# Altium footprint library TH IC footprints.PcbLib: 94 footprints (part 4 of 6)
Each footprint in its own frame and in the unit in brackets; x right, y up, seen from the top. Pads: shape width x height; smd on the part's side, far side on the other; paste and mask are expansions set on the pad; w line width, h text height; cw(c..) or ccw(c..) is an arc to the next point about the centre after c.
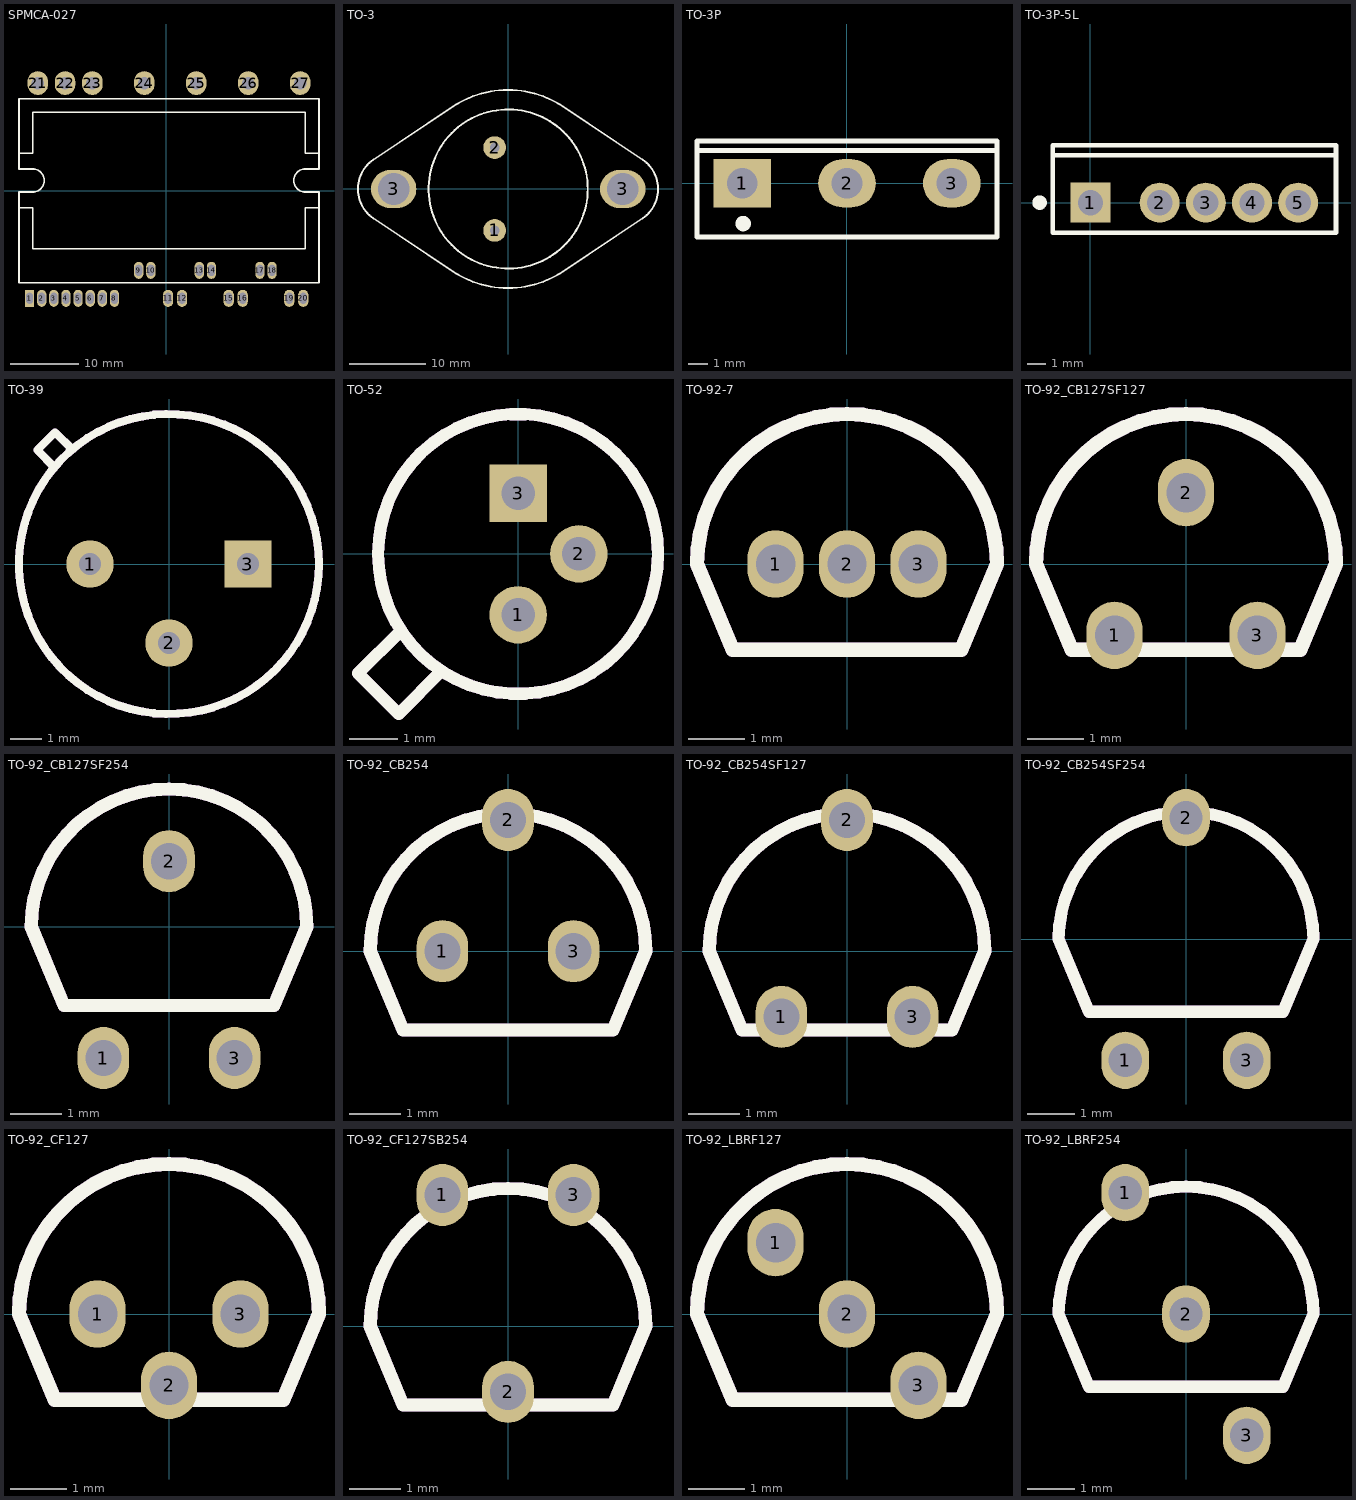
[diagram p3: the footprints below, top view; thin cyan lines are the x and y axes]

## SPMCA-027 [mm]
pads (27):
  rect 1.35x2.5 hole 1 slot 1.6 at 90 deg: 1(-20.07,-15.78)
  oval 1.35x2.5 hole 1 slot 1.6 at 90 deg: 2(-18.292,-15.78) 3(-16.514,-15.78) 4(-14.736,-15.78) 5(-12.958,-15.78) 6(-11.18,-15.78) 7(-9.402,-15.78) 8(-7.624,-15.78) 9(-4.068,-11.68) 10(-2.291,-11.68) 13(4.821,-11.68) 14(6.6,-11.68) 17(13.712,-11.68) 18(15.49,-11.68)
  oval 1.5x2.5 hole 1 slot 1.6 at 90 deg: 11(0.241,-15.78) 12(2.291,-15.78) 15(9.131,-15.78) 16(11.181,-15.78) 19(18.021,-15.78) 20(20.071,-15.78)
  oval 3x3.5 hole 1.8: 21(-18.863,15.78) 22(-14.863,15.78) 23(-10.863,15.78) 24(-3.243,15.78) 25(4.377,15.78) 26(11.997,15.78) 27(19.617,15.78)
Top Overlay:
  lines w0.254: -21.623,-2.5 -19.623,-2.5 -19.624,-8.5 20.377,-8.5 20.377,-2.5 22.377,-2.5 ; -21.623,5.5 -19.624,5.5 -19.623,11.5 20.377,11.5 20.377,5.5 22.377,5.5 ; -21.623,-13.5 22.377,-13.5 22.377,-0.2 20.377,-0.2 cw(c20.377,1.5) 20.377,3.2 22.377,3.2 22.377,13.5 -21.623,13.5 -21.623,3.2 -19.623,3.2 cw(c-19.623,1.5) -19.623,-0.2 -21.623,-0.2 -21.623,-13.5

## TO-3 [mm]
pads (4):
  round 3 hole 1.3: 1(-1.778,-5.461) 2(-1.778,5.461)
  oval 6x5 hole 4.2: 3(-15.113,0) 3(15.113,0)
Top Overlay:
  circle w0.254: c0,0 r10.5
  lines w0.254: -19.82,-0.051 ccw(c-15.22,-0.051) -17.773,-3.877 -7.246,-10.902 ccw(c-0.03,-0.089) -0.03,-13.089 -0.02,-13.089 ccw(c-0.02,-0.089) 7.196,-10.902 17.723,-3.877 ccw(c15.17,-0.051) 19.77,-0.051 19.77,0.051 ccw(c15.17,0.051) 17.723,3.877 7.196,10.902 ccw(c-0.02,0.089) -0.02,13.089 -0.03,13.089 ccw(c-0.03,0.089) -7.246,10.902 -17.773,3.877 ccw(c-15.22,0.051) -19.82,0.051 -19.82,-0.051
3D body "User Library-TO-3_Long.STEP": height 8.5, standoff -12, extent -19.757,-13.089 19.833,13.089

## TO-3P [mm]
pads (3):
  rect 3x2.5 hole 1.6: 1(-5.45,0)
  oval 3x2.5 hole 1.6: 2(0,0) 3(5.45,0)
Top Overlay:
  circle w0.4: c-5.4,-2.1 r0.2
  lines w0.254: -7.8,1.7 7.8,1.7 ; -7.8,-2.8 -7.8,2.2 7.8,2.2 7.8,-2.8 -7.8,-2.8
3D body "TO-3P.STEP": height 24.4, standoff -15.5, extent -7.9,-2.9 7.7,1.81

## TO-3P-5L [mm]
pads (5):
  rect 2.2x2.2 hole 1.4: 1(0,0)
  round 2.2 hole 1.4: 2(3.81,0) 3(6.35,0) 4(8.89,0) 5(11.43,0)
Top Overlay:
  circle w0.4: c-2.8,0 r0.2
  lines w0.254: -2.085,2.6 13.515,2.6 ; -2.085,-1.65 13.515,-1.65 13.515,3.15 -2.085,3.15 -2.085,-1.65

## TO-39 [mm]
pads (3):
  round 1.5 hole 0.7 mask+0.051: 1(-2.5,0) 2(0,-2.5)
  rect 1.5x1.5 hole 0.7 mask+0.051: 3(2.5,0)
Top Overlay:
  circle w0.254: c0,0 r4.75
  lines w0.254: -3.63,3.06 -4.17,3.61 -3.61,4.17 -3.06,3.63
Mechanical 13:
  circle w0.254: c0,0 r4.75
  lines w0.254: -3.63,3.06 -4.17,3.61 -3.61,4.17 -3.06,3.63

## TO-52 [mm]
pads (3):
  round 1.2 hole 0.7 mask+0.051: 1(0,-1.27) 2(1.27,0)
  rect 1.2x1.2 hole 0.7 mask+0.051: 3(0,1.27)
Top Overlay:
  circle w0.254: c0,0 r2.92
  lines w0.254: -2.44,-1.6 -3.34,-2.49 -2.49,-3.34 -1.6,-2.44
Mechanical 13:
  circle w0.254: c0,0 r2.92
  lines w0.254: -2.44,-1.6 -3.34,-2.49 -2.49,-3.34 -1.6,-2.44

## TO-92-7 [mm]
pads (3):
  oval 1x1.2 hole 0.7 mask+0.051: 1(-1.27,0) 2(0,0) 3(1.27,0)
Top Overlay:
  lines w0.254: -2.667,0 cw(c0,0) 2.667,0 2.032,-1.524 -2.032,-1.524 -2.667,0
Mechanical 13:
  lines w0.254: -2.667,0 cw(c0,0) 2.667,0 2.032,-1.524 -2.032,-1.524 -2.667,0
3D body "TO-92-7.SLDPRT": height 8.5, standoff -4, extent -2.5,-1.37 2.5,2.5

## TO-92_CB127SF127 [mm]
pads (3):
  oval 1x1.2 hole 0.7 mask+0.051: 1(-1.27,-1.27) 2(0,1.27) 3(1.27,-1.27)
Top Overlay:
  lines w0.254: -2.667,0 cw(c0,0) 2.667,0 2.032,-1.524 -2.032,-1.524 -2.667,0
Mechanical 13:
  lines w0.254: -2.667,0 cw(c0,0) 2.667,0 2.032,-1.524 -2.032,-1.524 -2.667,0
3D body "TO-92_CB127SF127.SLDPRT": height 9.6, standoff -2.9, extent -2.5,-1.47 2.5,2.5

## TO-92_CB127SF254 [mm]
pads (3):
  oval 1x1.2 hole 0.7 mask+0.051: 1(-1.27,-2.54) 2(0,1.27) 3(1.27,-2.54)
Top Overlay:
  lines w0.254: -2.667,0 cw(c0,0) 2.667,0 2.032,-1.524 -2.032,-1.524 -2.667,0
Mechanical 13:
  lines w0.254: -2.667,0 cw(c0,0) 2.667,0 2.032,-1.524 -2.032,-1.524 -2.667,0
3D body "TO-92_CB127SF254.SLDPRT": height 9.6, standoff -2.9, extent -2.5,-2.74 2.5,2.5

## TO-92_CB254 [mm]
pads (3):
  oval 1x1.2 hole 0.7 mask+0.051: 1(-1.27,0) 2(0,2.54) 3(1.27,0)
Top Overlay:
  lines w0.254: -2.667,0 cw(c0,0) 2.667,0 2.032,-1.524 -2.032,-1.524 -2.667,0
Mechanical 13:
  lines w0.254: -2.667,0 cw(c0,0) 2.667,0 2.032,-1.524 -2.032,-1.524 -2.667,0
3D body "TO-92_CB254.SLDPRT": height 9.6, standoff -2.9, extent -2.5,-1.37 2.5,2.74

## TO-92_CB254SF127 [mm]
pads (3):
  oval 1x1.2 hole 0.7 mask+0.051: 1(-1.27,-1.27) 2(0,2.54) 3(1.27,-1.27)
Top Overlay:
  lines w0.254: -2.667,0 cw(c0,0) 2.667,0 2.032,-1.524 -2.032,-1.524 -2.667,0
Mechanical 13:
  lines w0.254: -2.667,0 cw(c0,0) 2.667,0 2.032,-1.524 -2.032,-1.524 -2.667,0
3D body "TO-92_CB254SF127.SLDPRT": height 9.6, standoff -2.9, extent -2.5,-1.47 2.5,2.74

## TO-92_CB254SF254 [mm]
pads (3):
  oval 1x1.2 hole 0.7 mask+0.051: 1(-1.27,-2.54) 2(0,2.54) 3(1.27,-2.54)
Top Overlay:
  lines w0.254: -2.667,0 cw(c0,0) 2.667,0 2.032,-1.524 -2.032,-1.524 -2.667,0
Mechanical 13:
  lines w0.254: -2.667,0 cw(c0,0) 2.667,0 2.032,-1.524 -2.032,-1.524 -2.667,0
3D body "TO-92_CB254SF254.SLDPRT": height 9.6, standoff -2.9, extent -2.5,-2.74 2.5,2.74

## TO-92_CF127 [mm]
pads (3):
  oval 1x1.2 hole 0.7 mask+0.051: 1(-1.27,0) 2(0,-1.27) 3(1.27,0)
Top Overlay:
  lines w0.254: -2.667,0 cw(c0,0) 2.667,0 2.032,-1.524 -2.032,-1.524 -2.667,0
Mechanical 13:
  lines w0.254: -2.667,0 cw(c0,0) 2.667,0 2.032,-1.524 -2.032,-1.524 -2.667,0
3D body "TO-92_CF127.SLDPRT": height 8.5, standoff -4, extent -2.5,-1.47 2.5,2.5

## TO-92_CF127SB254 [mm]
pads (3):
  oval 1x1.2 hole 0.7 mask+0.051: 1(-1.27,2.54) 2(0,-1.27) 3(1.27,2.54)
Top Overlay:
  lines w0.254: -2.667,0 cw(c0,0) 2.667,0 2.032,-1.524 -2.032,-1.524 -2.667,0
Mechanical 13:
  lines w0.254: -2.667,0 cw(c0,0) 2.667,0 2.032,-1.524 -2.032,-1.524 -2.667,0
3D body "TO-92_CF127SB254.SLDPRT": height 9.6, standoff -2.9, extent -2.5,-1.47 2.5,2.74

## TO-92_LBRF127 [mm]
pads (3):
  oval 1x1.2 hole 0.7 mask+0.051: 1(-1.27,1.27) 2(0,0) 3(1.27,-1.27)
Top Overlay:
  lines w0.254: -2.667,0 cw(c0,0) 2.667,0 2.032,-1.524 -2.032,-1.524 -2.667,0
Mechanical 13:
  lines w0.254: -2.667,0 cw(c0,0) 2.667,0 2.032,-1.524 -2.032,-1.524 -2.667,0
3D body "TO-92_LBRF127.SLDPRT": height 8.5, standoff -4, extent -2.5,-1.47 2.5,2.5

## TO-92_LBRF254 [mm]
pads (3):
  oval 1x1.2 hole 0.7 mask+0.051: 1(-1.27,2.54) 2(0,0) 3(1.27,-2.54)
Top Overlay:
  lines w0.254: -2.667,0 cw(c0,0) 2.667,0 2.032,-1.524 -2.032,-1.524 -2.667,0
Mechanical 13:
  lines w0.254: -2.667,0 cw(c0,0) 2.667,0 2.032,-1.524 -2.032,-1.524 -2.667,0
3D body "TO-92_LBRF254.SLDPRT": height 9.6, standoff -2.9, extent -2.5,-2.74 2.5,2.74